# Altium footprint library Transformers.PcbLib: 102 footprints (part 1 of 7)
Each footprint in its own frame and in the unit in brackets; x right, y up, seen from the top. Pads: shape width x height; smd on the part's side, far side on the other; paste and mask are expansions set on the pad; w line width, h text height; cw(c..) or ccw(c..) is an arc to the next point about the centre after c.
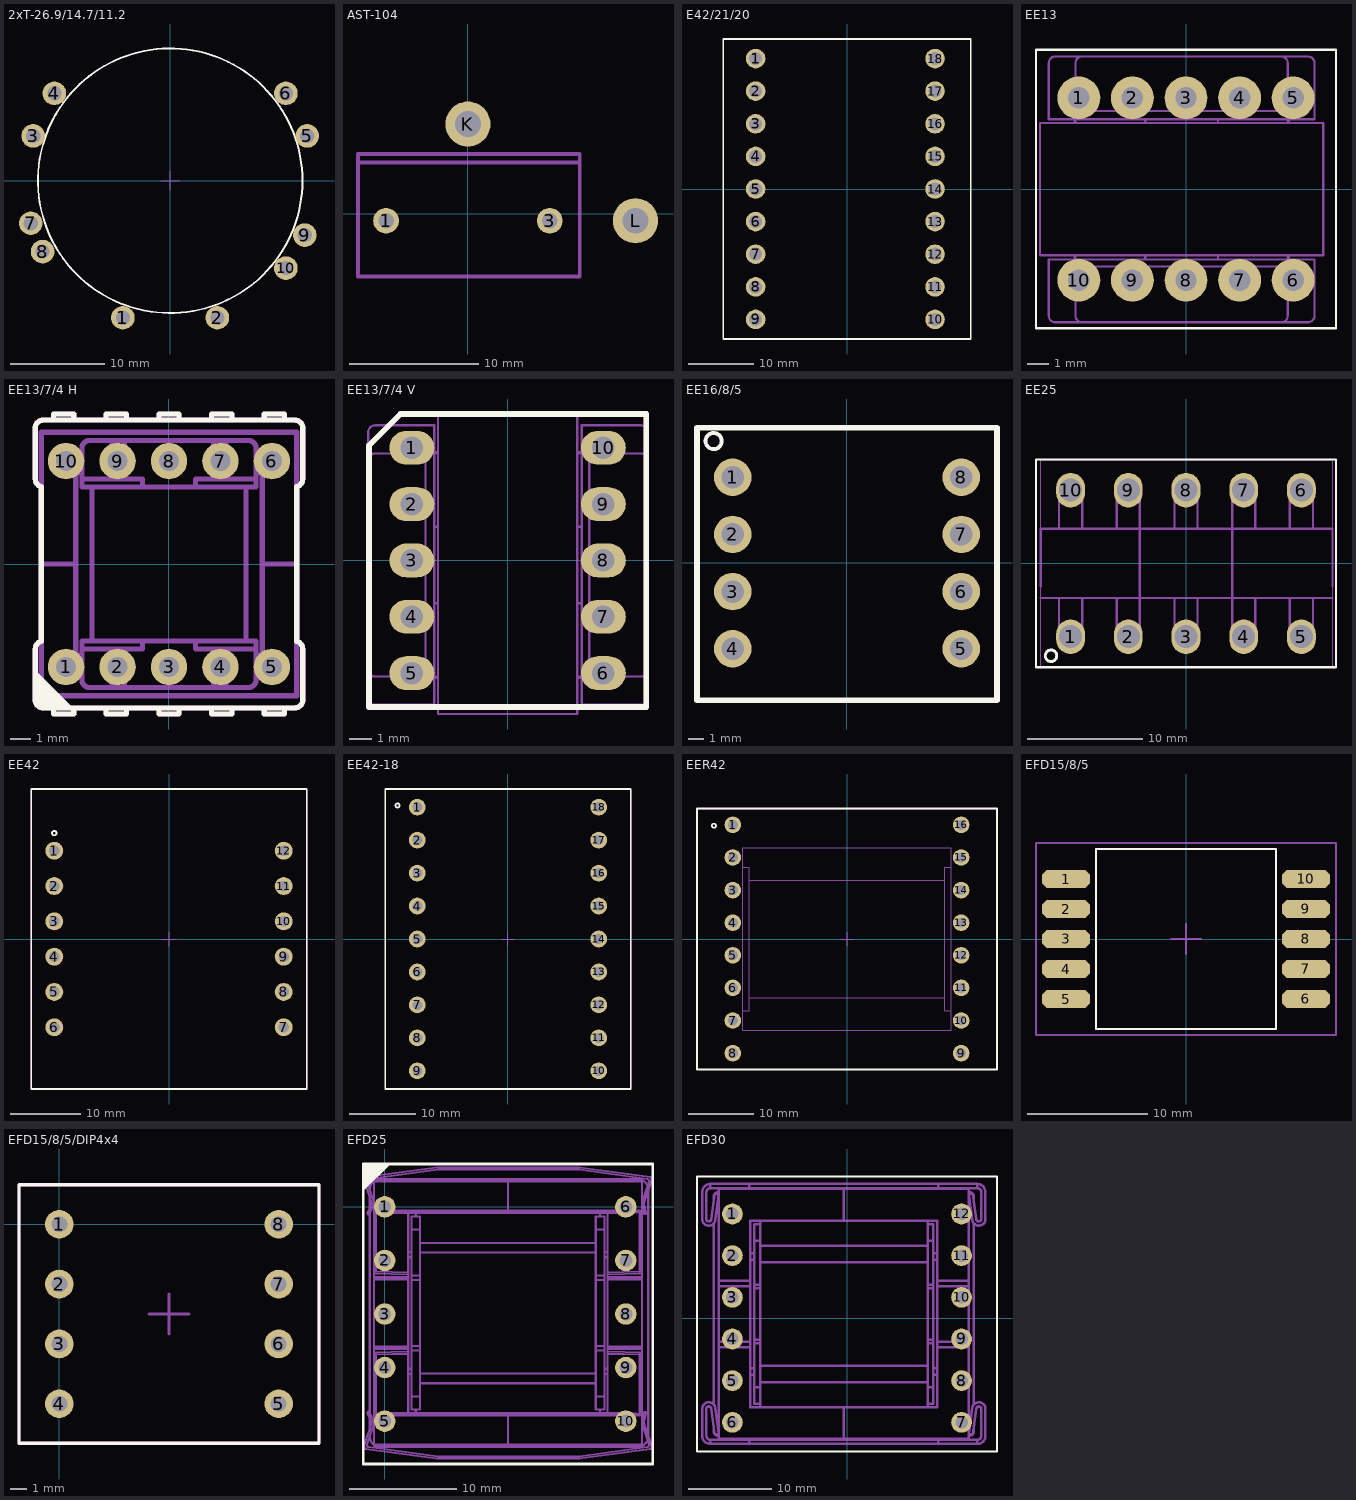
[diagram p0: the footprints below, top view; thin cyan lines are the x and y axes]

## 2xT-26.9/14.7/11.2 [mm]
height 35
pads (10):
  round 2.5 hole 1.5: 1(-5,-14.5) 2(5,-14.5) 3(-14.5,4.75) 4(-12.25,9.25) 5(14.5,4.75) 6(12.25,9.25) 7(-14.75,-4.5) 8(-13.5,-7.5) 9(14.25,-5.75) 10(12.25,-9.25)
Top Overlay:
  circle w0.2: c0,0 r14
Top Assembly:
  circle w0.1: c0,0 r14
Top Component Outline (Mech15):
  lines w0.1: -1,0 0,0 ; 0,-1 0,-0.5 0,0 ; 0,1 0,0 ; 1,0 0,0
3D body "T26.9_14.7_11.2.STEP": height 11.2, standoff 0, extent -13.45,-13.45 13.45,13.45
3D body "T26.9_14.7_11.2.STEP": height 22.4, standoff 11.2, extent -13.45,-13.45 13.45,13.45

## AST-104 [mm]
pads (4):
  round 2 hole 1.2: 1(-6.35,-0.53) 3(6.35,-0.53)
  round 3.5 hole 2: K(0,6.97) L(13,-0.53)
Top Assembly:
  lines w0.3: -8.525,-4.351 -8.525,4.649 8.675,4.649 8.675,-4.351 ; -8.525,-4.851 8.675,-4.851 8.675,4 -8.525,4 -8.525,-4.851
3D body "46722.stp": height 23.6, standoff -0.8, extent -8.525,-4.851 8.675,4.649

## E42/21/20 [mm]
pads (18):
  round 3 hole 2: 1(-14,20) 2(-14,15) 3(-14,10) 4(-14,5) 5(-14,0) 6(-14,-5) 7(-14,-10) 8(-14,-15) 9(-14,-20) 10(13.5,-20) 11(13.5,-15) 12(13.5,-10) 13(13.5,-5) 14(13.5,0) 15(13.5,5) 16(13.5,10) 17(13.5,15) 18(13.5,20)
Top Overlay:
  lines w0.254: -19,-23 -19,23 19,23 19,-23 -19,-23
3D body "E42_20-K-V-18P-SS-YW185_zИo-enie.STEP": height 50.85, standoff -2.45, extent -18.5,-22.65 18.5,22.65

## EE13 [mm]
pads (10):
  round 2 hole 1 unplated paste-25.4: 1(-5,4.25) 2(-2.5,4.25) 3(0,4.25) 4(2.5,4.25) 5(5,4.25) 6(5,-4.25) 7(2.5,-4.25) 8(0,-4.25) 9(-2.5,-4.25) 10(-5,-4.25)
Top Overlay:
  lines w0.1: -7,-6.5 -7,6.5 7,6.5 7,-6.5 -7,-6.5
Top Assembly:
  lines w0.1: -5.203,-3.092 -5.203,-3.294 -6.403,-3.294 -6.403,-5.919 ccw(c-6.103,-5.919) -6.103,-6.219 -4.853,-6.219 ; -5.203,3.082 -5.203,3.256 -6.403,3.256 -6.403,5.881 cw(c-6.103,5.881) -6.103,6.181 -4.853,6.181 ; -5.153,-3.092 -5.153,-3.294 ; -5.153,3.082 -5.153,3.256 ; -1.903,-3.294 -1.903,-3.092 ; -1.903,3.082 -1.903,3.255 ; 1.497,-3.294 1.497,-3.092 ; 1.497,3.082 1.497,3.255 ; 4.747,-3.092 4.747,-3.294 ; 4.747,3.082 4.747,3.255 ; 4.797,-3.092 4.797,-3.294 5.997,-3.294 5.997,-5.919 cw(c5.697,-5.919) 5.697,-6.219 4.447,-6.219 ; 4.797,3.082 4.797,3.256 5.997,3.256 5.997,5.881 ccw(c5.697,5.881) 5.697,6.181 4.447,6.181 ; -5.153,-3.625 -5.153,-3.294 ; -5.153,-3.625 -5.153,-5.919 ccw(c-4.853,-5.919) -4.853,-6.219 ; -5.153,-3.625 4.747,-3.625 ; -5.153,-3.294 4.747,-3.294 ; -5.153,3.256 -5.153,3.644 ; -5.153,3.256 -1.903,3.256 ; -5.153,3.644 -5.153,5.881 cw(c-4.853,5.881) -4.853,6.181 ; -5.153,3.644 4.747,3.644 ; -4.853,-6.219 4.447,-6.219 ; -4.853,6.181 4.447,6.181 ; -1.903,3.256 1.497,3.256 ; 1.497,3.255 4.747,3.255 ; 4.447,-6.219 ccw(c4.447,-5.919) 4.747,-5.919 4.747,-3.625 ; 4.447,6.181 cw(c4.447,5.881) 4.747,5.881 4.747,3.644 ; 4.747,-3.625 4.747,-3.294 ; 4.747,3.255 4.747,3.644 ; -6.813,-3.092 -6.813,3.082 6.407,3.082 6.407,-3.092 -6.813,-3.092
3D body "User Library-EE13-T304.step": height 12.88, standoff -3.67, extent -6.61,-6.2 6.61,6.2

## EE13/7/4 H [mm]
pads (10):
  round 1.8 hole 1: 1(-5.08,-5.08) 2(-2.54,-5.08) 3(0,-5.08) 4(2.54,-5.08) 5(5.08,-5.08) 6(5.08,5.08) 7(2.54,5.08) 8(0,5.08) 9(-2.54,5.08) 10(-5.08,5.08)
Top Overlay:
  lines w0.254: -6.6,-6.6 -6.1,-7.1 ; -6.6,-6.3 -5.8,-7.1 ; -6.6,-6 -5.5,-7.1 ; -6.6,-5.7 -5.2,-7.1 ; -6.6,-5.4 -4.9,-7.1 ; -6.3,-3.8 -6.3,3.8 ; -6.297,-3.812 ccw(c-6.2,-4.2) -6.6,-4.2 -6.6,-6.7 ccw(c-6.2,-6.7) -6.2,-7.1 6.2,-7.1 ccw(c6.2,-6.7) 6.6,-6.7 6.6,-4.2 ccw(c6.2,-4.2) 6.297,-3.812 ; -6.297,3.812 cw(c-6.2,4.2) -6.6,4.2 -6.6,6.7 cw(c-6.2,6.7) -6.2,7.1 6.2,7.1 cw(c6.2,6.7) 6.6,6.7 6.6,4.2 cw(c6.2,4.2) 6.297,3.812 ; -5.7,-7.1 -5.7,-7.4 -4.7,-7.4 -4.7,-7.1 ; -5.7,7.1 -5.7,7.4 -4.7,7.4 -4.7,7.1 ; -3.1,-7.1 -3.1,-7.4 -2.1,-7.4 -2.1,-7.1 ; -3.1,7.1 -3.1,7.4 -2.1,7.4 -2.1,7.1 ; -0.5,-7.1 -0.5,-7.4 0.5,-7.4 0.5,-7.1 ; -0.5,7.1 -0.5,7.4 0.5,7.4 0.5,7.1 ; 2.1,-7.1 2.1,-7.4 3.1,-7.4 3.1,-7.1 ; 2.1,7.1 2.1,7.4 3.1,7.4 3.1,7.1 ; 4.7,-7.1 4.7,-7.4 5.7,-7.4 5.7,-7.1 ; 4.7,7.1 4.7,7.4 5.7,7.4 5.7,7.1 ; 6.3,-3.8 6.3,3.8
Top Assembly:
  lines w0.254: -6.3,0 -4.6,0 ; -6.297,-3.812 ccw(c-6.2,-4.2) -6.6,-4.2 -6.6,-6.7 ccw(c-6.2,-6.7) -6.2,-7.1 6.2,-7.1 ccw(c6.2,-6.7) 6.6,-6.7 6.6,-4.2 ccw(c6.2,-4.2) 6.297,-3.812 ; -6.297,3.812 cw(c-6.2,4.2) -6.6,4.2 -6.6,6.7 cw(c-6.2,6.7) -6.2,7.1 6.2,7.1 cw(c6.2,6.7) 6.6,6.7 6.6,4.2 cw(c6.2,4.2) 6.297,3.812 ; -5.7,-7.1 -5.7,-7.4 -4.7,-7.4 -4.7,-7.1 ; -5.7,7.1 -5.7,7.4 -4.7,7.4 -4.7,7.1 ; -4.3,-4.5 -4.6,-4.5 -4.6,4.5 -4.3,4.5 ; -4.3,-4.2 -1.3,-4.2 -1.3,-3.8 ; -4.3,4.2 -1.3,4.2 -1.3,3.8 ; -3.8,-3.8 -3.8,3.8 ; -3.1,-7.1 -3.1,-7.4 -2.1,-7.4 -2.1,-7.1 ; -3.1,7.1 -3.1,7.4 -2.1,7.4 -2.1,7.1 ; -2.8,-6.1 -2.8,-4.2 ; -2.8,4.2 -2.8,6.1 ; -2.2,-6.1 -2.2,-4.2 ; -2.2,4.2 -2.2,6.1 ; -0.5,-7.1 -0.5,-7.4 0.5,-7.4 0.5,-7.1 ; -0.5,7.1 -0.5,7.4 0.5,7.4 0.5,7.1 ; 1.3,-3.8 1.3,-4.2 4.3,-4.2 ; 1.3,3.8 1.3,4.2 4.3,4.2 ; 2.1,-7.1 2.1,-7.4 3.1,-7.4 3.1,-7.1 ; 2.1,7.1 2.1,7.4 3.1,7.4 3.1,7.1 ; 2.2,-6.1 2.2,-4.2 ; 2.2,4.2 2.2,6.1 ; 2.8,-6.1 2.8,-4.2 ; 2.8,4.2 2.8,6.1 ; 3.8,-3.8 3.8,3.8 ; 4.3,-4.5 4.6,-4.5 4.6,4.5 4.3,4.5 ; 4.6,0 6.3,0 ; 4.7,-7.1 4.7,-7.4 5.7,-7.4 5.7,-7.1 ; 4.7,7.1 4.7,7.4 5.7,7.4 5.7,7.1 ; -6.3,-6.5 6.3,-6.5 6.3,6.5 -6.3,6.5 -6.3,-6.5 ; -4.3,-5.7 ccw(c-3.9,-5.7) -3.9,-6.1 3.9,-6.1 ccw(c3.9,-5.7) 4.3,-5.7 4.3,-3.8 -4.3,-3.8 -4.3,-5.7 ; -4.3,3.8 -4.3,5.7 cw(c-3.9,5.7) -3.9,6.1 3.9,6.1 cw(c3.9,5.7) 4.3,5.7 4.3,3.8 -4.3,3.8
  text "1" at -4,-6.4 h2.82
3D body "EF12.6-K-H-10P-P1203_zИo-enie.STEP": height 9.65, standoff -4.15, extent -6.7,-7.55 6.7,7.55

## EE13/7/4 V [mm]
pads (10):
  oval 2x1.5 hole 1: 1(-4.25,5) 2(-4.25,2.5) 3(-4.25,0) 4(-4.25,-2.5) 5(-4.25,-5) 6(4.25,-5) 7(4.25,-2.5) 8(4.25,0) 9(4.25,2.5) 10(4.25,5)
Top Overlay:
  lines w0.254: -6.15,-6.5 -6.15,5.1 -4.75,6.5 6.15,6.5 6.15,-6.5 -6.15,-6.5
Top Assembly:
  lines w0.1: -3.082,-5.203 -3.256,-5.203 -3.256,-6.403 -5.881,-6.403 cw(c-5.881,-6.103) -6.181,-6.103 -6.181,-4.853 ; -3.082,-5.153 -3.256,-5.153 ; -3.082,-1.903 -3.256,-1.903 ; -3.082,1.497 -3.256,1.497 ; -3.082,4.747 -3.256,4.747 ; -3.082,4.797 -3.256,4.797 -3.256,5.997 -5.881,5.997 ccw(c-5.881,5.697) -6.181,5.697 -6.181,4.447 ; 3.092,-5.203 3.294,-5.203 3.294,-6.403 5.919,-6.403 ccw(c5.919,-6.103) 6.219,-6.103 6.219,-4.853 ; 3.092,-5.153 3.294,-5.153 ; 3.092,-1.903 3.294,-1.903 ; 3.092,1.497 3.294,1.497 ; 3.092,4.747 3.294,4.747 ; 3.092,4.797 3.294,4.797 3.294,5.997 5.919,5.997 cw(c5.919,5.697) 6.219,5.697 6.219,4.447 ; -6.181,-4.853 ccw(c-5.881,-4.853) -5.881,-5.153 -3.644,-5.153 ; -6.181,-4.853 -6.181,4.447 ; -6.181,4.447 cw(c-5.881,4.447) -5.881,4.747 -3.644,4.747 ; -3.644,-5.153 -3.256,-5.153 ; -3.644,-5.153 -3.644,4.747 ; -3.644,4.747 -3.256,4.747 ; -3.256,-5.153 -3.256,-1.903 ; -3.256,-1.903 -3.256,1.497 ; -3.256,1.497 -3.256,4.747 ; 3.294,-5.153 3.294,4.747 ; 3.294,-5.153 3.624,-5.153 ; 3.294,4.747 3.624,4.747 ; 3.624,-5.153 3.624,4.747 ; 3.624,-5.153 5.919,-5.153 ccw(c5.919,-4.853) 6.219,-4.853 ; 3.624,4.747 5.919,4.747 cw(c5.919,4.447) 6.219,4.447 ; 6.219,-4.853 6.219,4.447 ; -3.082,-6.813 -3.082,6.407 3.092,6.407 3.092,-6.813 -3.082,-6.813
  lines w0.254: -6.15,-6.5 6.15,-6.5 6.15,6.5 -4.75,6.5 -6.15,5.1 -6.15,-6.5
3D body "EE13-K-V-10P-SS_zИo-enie.STEP": height 14.4, standoff -2.45, extent -6.15,-6.5 6.15,6.5

## EE16/8/5 [mm]
pads (8):
  round 2.5 hole 1.5: 1(-7.62,5.715) 2(-7.62,1.905) 3(-7.62,-1.905) 4(-7.62,-5.715) 5(7.62,-5.715) 6(7.62,-1.905) 7(7.62,1.905) 8(7.62,5.715)
Top Overlay:
  circle w0.254: c-8.89,8.128 r0.539
  lines w0.381: -10,-9.149 10,-9.149 10,9.017 -10,9.017 -10,-9.149
Top Assembly:
  circle w0.254: c-8.89,8.128 r0.539
  lines w0.1: -10,-9.152 -10,9.014 10,9.014 10,-9.152 -10,-9.152
3D body "User Library-Ensamblaje trafo 16-8-5.STEP": height 14.97, standoff -1.73, extent -10,-9.152 10,9.011

## EE25 [mm]
pads (10):
  oval 2.5x3 hole 2: 1(-10,-6.35) 2(-5,-6.35) 3(0,-6.35) 4(5,-6.35) 5(10,-6.35) 6(10,6.35) 7(5,6.35) 8(0,6.35) 9(-5,6.35) 10(-10,6.35)
Top Overlay:
  circle w0.254: c-11.7,-8 r0.5
  lines w0.2: -13,-9 -13,9 13,9 13,-9 -13,-9
Top Assembly:
  lines w0.1: -12.7,-9 12.7,-9 12.7,9 -12.6,9 -12.6,-9.1
  lines w0.2: -12.6,-3 12.7,-3 ; -12.6,-2 -12.6,3 12.7,3 12.7,-2 ; -11,-3 -11,-6 -9,-6 -9,-3 ; -11,3 -11,6 -9,6 -9,3 ; -6,-3 -6,-6 -4,-6 -4,-3 ; -6,3 -6,6 -4,6 -4,3 -4,-3 ; -1,-3 -1,-6 1,-6 1,-3 ; -1,3 -1,6 1,6 1,3 ; 6,-3 6,-6 4,-6 4,-3 ; 6,3 6,6 4,6 4,3 4,-3 ; 9,-3 9,-6 11,-6 11,-3 ; 9,3 9,6 11,6 11,3 ; -4,-3 4,-3
3D body "User Library-Trafo EE25.step": height 32.35, standoff -3.5, extent -12.7,-9 12.7,9

## EE42 [mm]
pads (12):
  round 2.54 hole 1.5: 1(-16.25,12.5) 2(-16.25,7.5) 3(-16.25,2.5) 4(-16.25,-2.5) 5(-16.25,-7.5) 6(-16.25,-12.5) 7(16.25,-12.5) 8(16.25,-7.5) 9(16.25,-2.5) 10(16.25,2.5) 11(16.25,7.5) 12(16.25,12.5)
Top Overlay:
  circle w0.254: c-16.25,15 r0.316
  lines w0.254: -19.5,-21.25 19.5,-21.25 19.5,21.25 -19.5,21.25 -19.5,-21.25
Top Assembly:
  lines w0.178: -19.5,-21.25 19.5,-21.25 19.5,21.25 -19.5,21.25 -19.5,-21.25
Top Component Outline (Mech15):
  lines w0.15: -1,0 1,0 ; 0,-1 0,1
3D body "EE42 6+6.step": height 43.3, standoff -5.85, extent -19.5,-21.25 19.5,21.25

## EE42-18 [mm]
pads (18):
  round 2.54 hole 1.5: 1(-13.75,20) 2(-13.75,15) 3(-13.75,10) 4(-13.75,5) 5(-13.75,0) 6(-13.75,-5) 7(-13.75,-10) 8(-13.75,-15) 9(-13.75,-20) 10(13.75,-20) 11(13.75,-15) 12(13.75,-10) 13(13.75,-5) 14(13.75,0) 15(13.75,5) 16(13.75,10) 17(13.75,15) 18(13.75,20)
Top Overlay:
  circle w0.254: c-16.75,20.25 r0.316
  lines w0.254: -18.6,-22.75 -18.6,22.75 18.6,22.75 18.6,-22.75 -18.6,-22.75
Top Assembly:
  lines w0.178: -18.6,-22.75 -18.6,22.75 18.6,22.75 18.6,-22.75 -18.6,-22.75
Top Component Outline (Mech15):
  lines w0.15: -1,0 1,0 ; 0,-1 0,1
3D body "EER42 9X9.step": height 46.67, standoff -3.45, extent -16.05,-22.5 16.05,22.5

## EER42 [mm]
pads (16):
  round 2.54 hole 1.5: 1(-17.5,17.5) 2(-17.5,12.5) 3(-17.5,7.5) 4(-17.5,2.5) 5(-17.5,-2.5) 6(-17.5,-7.5) 7(-17.5,-12.5) 8(-17.5,-17.5) 9(17.5,-17.5) 10(17.5,-12.5) 11(17.5,-7.5) 12(17.5,-2.5) 13(17.5,2.5) 14(17.5,7.5) 15(17.5,12.5) 16(17.5,17.5)
Top Overlay:
  circle w0.254: c-20.408,17.376 r0.316
  lines w0.254: -23,-20 23,-20 23,20 -23,20 -23,-20
Top Assembly:
  lines w0.178: -16,-11 -15,-11 -15,11 -16,11 ; -15,-9 15,-9 ; -15,9 15,9 ; 16,-11 15,-11 15,11 16,11 ; -23,-20 23,-20 23,20 -23,20 -23,-20 ; -16,-14 16,-14 16,14 -16,14 -16,-14
Top Component Outline (Mech15):
  lines w0.15: -1,0 1,0 ; 0,-1 0,1
3D body "User Library-power_transformer.step": height 33.94, standoff -2.5, extent -21.512,-20.193 22.528,19.812

## EF20 [mm]

## EFD15/8/5 [mm] "Каркас BH-EFD15-1-10S (PHL)"
pads (10):
  oct 4x1.5 smd: 1(-10,5) 2(-10,2.5) 3(-10,0) 4(-10,-2.5) 5(-10,-5) 6(10,-5) 7(10,-2.5) 8(10,0) 9(10,2.5) 10(10,5)
Top Overlay:
  lines w0.2: -7.5,-7.5 -7.5,7.5 7.5,7.5 7.5,-7.5 -7.5,-7.5
Top Assembly:
  lines w0.2: -7.5,-7.5 7.5,-7.5 7.5,7.5 -7.5,7.5 -7.5,-7.5
Top Component Outline (Mech15):
  lines w0.2: -1.25,0 1.25,0 ; 0,-1.25 0,1.25 ; -12.5,-8 12.5,-8 12.5,8 -12.5,8 -12.5,-8
3D body "Efd-15m.STEP": height 8, standoff 0, extent -10.65,-7.5 10.65,7.5

## EFD15/8/5/DIP4x4 [mm] "Каркас BH-EFD15-1-8R (PHL)"
pads (8):
  round 1.8 hole 1 paste-25.4: 1(0,0) 2(0,-3.75) 3(0,-7.5) 4(0,-11.25) 5(13.75,-11.25) 6(13.75,-7.5) 7(13.75,-3.75) 8(13.75,0)
Top Overlay:
  lines w0.2: -2.525,-13.725 -2.525,2.475 16.275,2.475 16.275,-13.725 -2.525,-13.725
Top Assembly:
  lines w0.2: -2.525,-13.725 16.275,-13.725 16.275,2.475 -2.525,2.475 -2.525,-13.725
Top Component Outline (Mech15):
  lines w0.2: 5.625,-5.625 8.125,-5.625 ; 6.875,-6.875 6.875,-4.375 ; -2.525,-13.725 16.275,-13.725 16.275,2.475 -2.525,2.475 -2.525,-13.725
3D body "Efd-15.stp": height 8.35, standoff -2.45, extent -2.525,-13.725 16.275,2.475

## EFD25 [mm]
pads (10):
  round 2 hole 1.2 unplated paste-25.4: 1(0,0) 2(0,-5) 3(0,-10) 4(0,-15) 5(0,-20) 6(22.5,0) 7(22.5,-5) 8(22.5,-10) 9(22.5,-15) 10(22.5,-20)
Top Overlay:
  region: -2,1.5 0.5,4 -2,4
  lines w0.254: -2,-24 25,-24 25,4 -2,4 -2,-24
Top Assembly:
  drawing of 1009 lines, arcs and shapes, not listed
3D body "User Library-EFD-25-13-9.step": height 12.9, standoff -3.5, extent -2.134,-23.589 24.734,3.59

## EFD30 [mm]
pads (12):
  round 2.5 hole 1.5 paste-25.4: 1(-13.75,12.5) 2(-13.75,7.5) 3(-13.75,2.5) 4(-13.75,-2.5) 5(-13.75,-7.5) 6(-13.75,-12.5) 7(13.75,-12.5) 8(13.75,-7.5) 9(13.75,-2.5) 10(13.75,2.5) 11(13.75,7.5) 12(13.75,12.5)
Top Overlay:
  lines w0.2: -18,-16 18,-16 18,17 -18,17 -18,-16
Top Assembly:
  drawing of 172 lines, arcs and shapes, not listed
3D body "User Library-EFD30-1.step": height 16, standoff -0.1, extent -17,-15.6 17,15.6